# Altium integrated library Diode.IntLib: 8 symbols
Pins are listed as number, name and electrical type; pins without a type are passive.

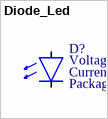
[diagram p0: symbol Diode_Led]

## Diode_Led
designator D?
Component Category: Diode; ComponentLink1Description: Datasheet; ComponentLink1URL: *; ComponentLink2Description: Supplier Link; ComponentLink2URL: *; Manufacturer Part Number: *; Supplier: *; Supplier Part Number: *; Manufacturer: *; Operating Temperature, Min: *℃; Operating Temperature, Max: *℃; Quantity, Min: *; Quantity, Max: *; Price, Min: *; Price, Max: *; Supplier Currency: *; Supplier Link: *; Component Type: Led; Current: *; Voltage: *; Package: *
footprint Diode_Smd_M1608_I0603_Blue
footprint Diode_Smd_M1608_I0603_Green-Yellow
footprint Diode_Smd_M1608_I0603_Green
footprint Diode_Smd_M1608_I0603_Orange1
footprint Diode_Smd_M1608_I0603_Orange2
footprint Diode_Smd_M1608_I0603_Red
footprint Diode_Smd_M1608_I0603_White
footprint Diode_Smd_M1608_I0603_Yellow
pins: A, C
8 alternate drawings of the same symbol


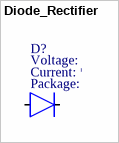
[diagram p1: symbol Diode_Rectifier]

## Diode_Rectifier
designator D?
Component Category: Diode; ComponentLink1Description: Datasheet; ComponentLink1URL: *; ComponentLink2Description: Supplier Link; ComponentLink2URL: *; Manufacturer Part Number: *; Supplier: *; Supplier Part Number: *; Manufacturer: *; Operating Temperature, Min: *℃; Operating Temperature, Max: *℃; Quantity, Min: *; Quantity, Max: *; Price, Min: *; Price, Max: *; Supplier Currency: *; Supplier Link: *; Component Type: Rectifier; Current: *; Voltage: *; Package: *
footprint Diode_SOD-523_SC-79
footprint Diode_SOD-123F
pins: A, C


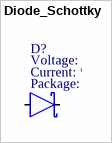
[diagram p2: symbol Diode_Schottky]

## Diode_Schottky
designator D?
Component Category: Diode; ComponentLink1Description: Datasheet; ComponentLink1URL: *; ComponentLink2Description: Supplier Link; ComponentLink2URL: *; Manufacturer Part Number: *; Supplier: *; Supplier Part Number: *; Manufacturer: *; Operating Temperature, Min: *℃; Operating Temperature, Max: *℃; Quantity, Min: *; Quantity, Max: *; Price, Min: *; Price, Max: *; Supplier Currency: *; Supplier Link: *; Component Type: Schottky; Current: *; Voltage: *; Package: *
footprint Diode_SOD-523_SC-79
footprint Diode_SOD-123F
pins: A, C


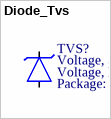
[diagram p3: symbol Diode_Tvs]

## Diode_Tvs
designator TVS?
Component Category: Diode; ComponentLink1Description: Datasheet; ComponentLink1URL: *; ComponentLink2Description: Supplier Link; ComponentLink2URL: *; Manufacturer Part Number: *; Supplier: *; Supplier Part Number: *; Manufacturer: *; Operating Temperature, Min: *℃; Operating Temperature, Max: *℃; Quantity, Min: *; Quantity, Max: *; Price, Min: *; Price, Max: *; Supplier Currency: *; Supplier Link: *; Component Type: Zener; Voltage, Break Down: *; Voltage, Stand Off: *; Package: *
footprint Diode_SOD-523_SC-79
pins: A, C


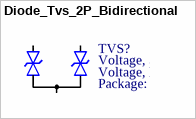
[diagram p4: symbol Diode_Tvs_2P_Bidirectional]

## Diode_Tvs_2P_Bidirectional
designator TVS?
Component Category: Diode; ComponentLink1Description: Datasheet; ComponentLink1URL: *; ComponentLink2Description: Supplier Link; ComponentLink2URL: *; Manufacturer Part Number: *; Supplier: *; Supplier Part Number: *; Manufacturer: *; Operating Temperature, Min: *℃; Operating Temperature, Max: *℃; Quantity, Min: *; Quantity, Max: *; Price, Min: *; Price, Max: *; Supplier Currency: *; Supplier Link: *; Component Type: TVS; Voltage, Break Down: *; Voltage, Stand Off: *; Package: *
footprint Diode_SOT-23-3_2P_Bidirectional_Type_1
pins: Common, D1, D2


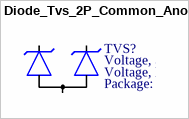
[diagram p5: symbol Diode_Tvs_2P_Common_Anode]

## Diode_Tvs_2P_Common_Anode
designator TVS?
Component Category: Diode; ComponentLink1Description: Datasheet; ComponentLink1URL: *; ComponentLink2Description: Supplier Link; ComponentLink2URL: *; Manufacturer Part Number: *; Supplier: *; Supplier Part Number: *; Manufacturer: *; Operating Temperature, Min: *℃; Operating Temperature, Max: *℃; Quantity, Min: *; Quantity, Max: *; Price, Min: *; Price, Max: *; Supplier Currency: *; Supplier Link: *; Component Type: Zener; Voltage, Break Down: *; Voltage, Stand Off: *; Package: *
footprint Diode_SOT-723_2P_Common_Anode_Type_1
pins: A, C1, C2


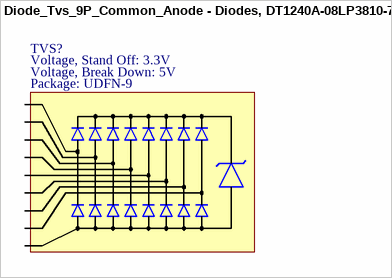
[diagram p6: symbol Diode_Tvs_9P_Common_Anode - Diodes, DT1240A-08LP3810-7]

## Diode_Tvs_9P_Common_Anode - Diodes, DT1240A-08LP3810-7
designator TVS?  Voltage, Break Down: 5V  Voltage, Stand Off: 3.3V  Package: UDFN-9  (hidden comment: *)
Manufacturer Part Number: DT1240A-08LP3810-7; Manufacturer: Diodes; Component Category: Diode; ComponentLink1Description: Datasheet; ComponentLink1URL: E:\Altium\Datasheets\Diode\Diodes, DT1240A-08LP3810-7.pdf; ComponentLink2Description: Supplier Link; ComponentLink2URL: https://www.digikey.com/en/products/detail/diodes-incorporated/dt1240a-08lp3810-7/8255867; Supplier: Digikey; Supplier Part Number: DT1240A-08LP3810-7DICT-ND; Operating Temperature, Min: -55℃; Operating Temperature, Max: +86℃; Quantity, Min: 1; Quantity, Max: 2500; Price, Min: 0.10245; Price, Max: 0.42; Supplier Currency: $; Supplier Link: https://www.digikey.com/en/products/detail/diodes-incorporated/dt1240a-08lp3810-7/8255867; Component Type: TVS
footprint Diode_Tvs_9P_Common_Anode - Diodes, DT1240A-08LP3810-7
pins: 1, 2, 3, 4, 5, 6, 7, 8, 9


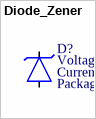
[diagram p7: symbol Diode_Zener]

## Diode_Zener
designator D?
Component Category: Diode; ComponentLink1Description: Datasheet; ComponentLink1URL: *; ComponentLink2Description: Supplier Link; ComponentLink2URL: *; Manufacturer Part Number: *; Supplier: *; Supplier Part Number: *; Manufacturer: *; Operating Temperature, Min: *℃; Operating Temperature, Max: *℃; Quantity, Min: *; Quantity, Max: *; Price, Min: *; Price, Max: *; Supplier Currency: *; Supplier Link: *; Component Type: Zener; Current: *; Voltage: *; Package: *
footprint Diode_SOD-523_SC-79
footprint Diode_SOD-123F
pins: A, C